# Altium footprint library Tracker_v1_1_pcb.PcbLib: 32 footprints (part 1 of 2)
Each footprint in its own frame and in the unit in brackets; x right, y up, seen from the top. Pads: shape width x height; smd on the part's side, far side on the other; paste and mask are expansions set on the pad; w line width, h text height; cw(c..) or ccw(c..) is an arc to the next point about the centre after c.
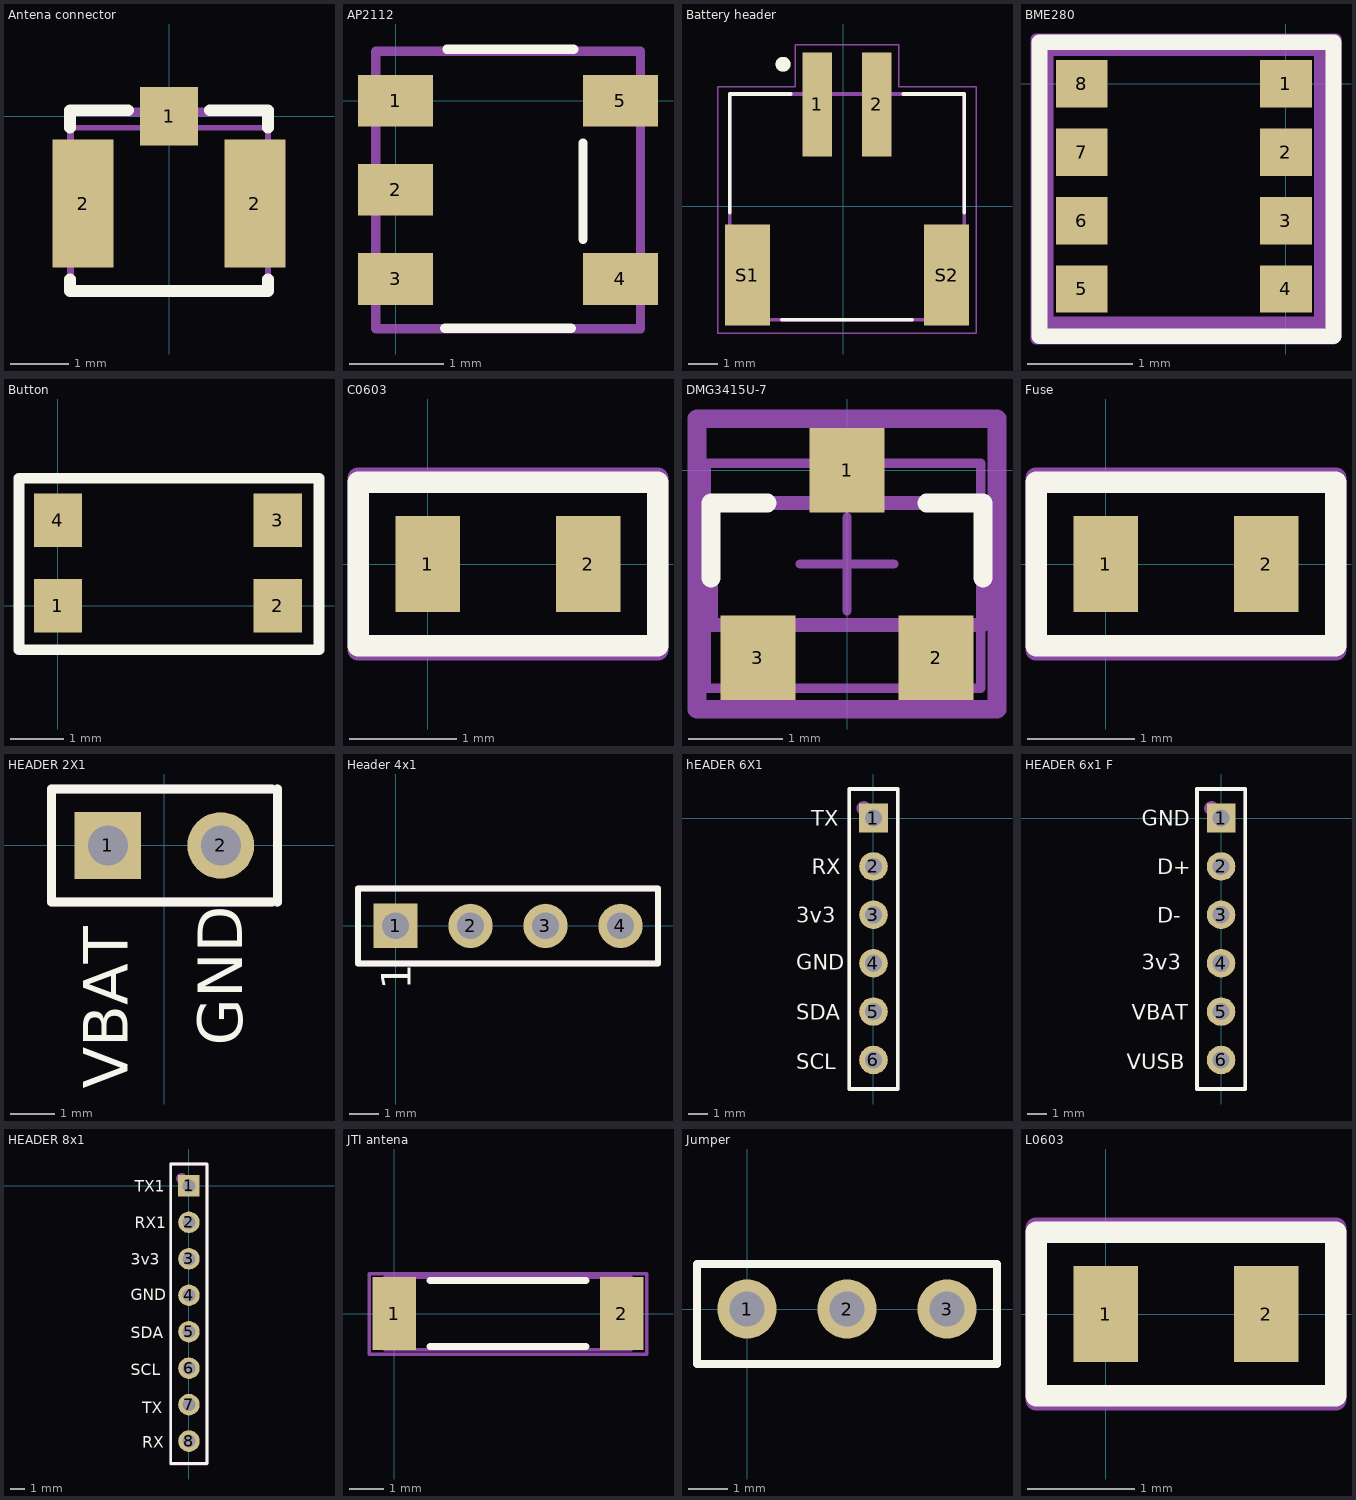
[diagram p0: the footprints below, top view; thin cyan lines are the x and y axes]

## Antena connector [mm]
pads (3):
  rect 1x1 smd: 1(0,0)
  rect 1.05x2.2 smd: 2(-1.475,-1.5) 2(1.475,-1.5)
Top Overlay:
  lines w0.2: -1.7,-2.8 -1.7,-3 1.7,-3 1.7,-2.8 ; -1.7,-0.2 -1.7,0.1 -0.7,0.1 ; 0.7,0.1 1.7,0.1 1.7,-0.2
Mechanical 16:
  lines w0.1: -1.7,-0.2 1.7,-0.2 ; -1.7,-3 -1.7,0.1 1.7,0.1 1.7,-3 -1.7,-3
Mechanical 29:
  lines w0.1: -1.69,-2.973 1.7,-2.973 1.7,0.047 -1.68,0.047 -1.68,-2.963 -1.69,-2.973
  text "'.Designator'" at -1.1,-1.673 h1
3D body "SW3dPS-UFL-R-SMD.STEP": height 1.25, standoff 0, extent -1.7,-2.923 1.7,0.177

## AP2112 [mm]
pads (5):
  rect 0.8x0.55 smd mask+0.05: 1(0,0) 2(0,-0.95) 3(0,-1.9) 4(2.4,-1.9) 5(2.4,0)
Top Overlay:
  lines w0.1: 0.525,-2.425 1.875,-2.425 ; 0.55,0.55 1.9,0.55 ; 2,-1.475 2,-0.45
Mechanical 29:
  lines w0.1: -0.212,-2.43 -0.212,0.53 2.613,0.53 2.613,-2.43 -0.212,-2.43
  text "'.Designator'" at 0.325,-1.25 h0.6
3D body "IC_Diodes_AP2112K-3.3TRG1_eec.STEP": height 1.3, standoff 0, extent -0.212,-2.43 2.613,0.53

## Battery header [mm]
pads (4):
  rect 1x3.5 smd: 1(-0.873,3.429) 2(1.127,3.429)
  rect 1.5x3.4 smd: S1(-3.223,-2.321) S2(3.477,-2.321)
Top Overlay:
  circle w0.3: c-2.023,4.779 r0.1
  lines w0.127: -3.823,-0.221 -3.823,3.779 -1.773,3.779 ; -2.073,-3.821 2.327,-3.821 ; 2.027,3.779 4.077,3.779 4.077,-0.221
Mechanical 4:
  circle w0.3: c-2.023,4.779 r0.1
  circle w0.3: c-2.023,4.779 r0.1
  lines w0.127: -3.823,-3.821 4.077,-3.821 ; -3.823,-3.821 -3.823,3.779 ; -3.823,-3.821 4.077,-3.821 ; -3.823,-3.821 -3.823,3.779 ; -3.823,3.779 4.077,3.779 ; -3.823,3.779 4.077,3.779 ; 4.077,-3.821 4.077,3.779 ; 4.077,-3.821 4.077,3.779
Mechanical 16:
  lines w0.05: -4.223,-4.271 4.477,-4.271 4.477,4.029 1.877,4.029 1.877,5.429 -1.623,5.429 -1.623,4.029 -4.223,4.029 -4.223,-4.271
3D body "S2B-PH-SM4-TB(LF)(SN)--3DModel-STEP-56544.STEP": height 5.5, standoff -0.1, extent -3.836,-3.665 4.064,4.935
3D body "S2B-PH-SM4-TB(LF)(SN)--3DModel-STEP-56544.STEP": height 5.5, standoff -0.1, extent -3.81,-4.191 4.09,4.409

## BME280 [mm]
pads (8):
  rect 0.49x0.45 smd: 1(0,0) 2(0,-0.65) 3(0,-1.3) 4(0,-1.95) 5(-1.94,-1.95) 6(-1.94,-1.3) 7(-1.94,-0.65) 8(-1.94,0)
Top Overlay:
  circle w0.2: c-0.057,0.014 r0.05
  lines w0.15: -2.343,-2.399 -2.343,0.395 0.451,0.395 0.451,-2.399 -2.343,-2.399
Mechanical 4:
  circle w0.2: c0.03,0.025 r0.05
  circle w0.2: c0.03,0.025 r0.05
  lines w0.127: -2.27,-2.275 0.33,-2.275 ; -2.27,-2.275 -2.27,0.325 ; -2.27,-2.275 0.33,-2.275 ; -2.27,-2.275 -2.27,0.325 ; -2.27,0.325 0.33,0.325 ; -2.27,0.325 0.33,0.325 ; 0.33,-2.275 0.33,0.325 ; 0.33,-2.275 0.33,0.325
Mechanical 29:
  circle w0.254: c-0.075,0.025 r0.035
  lines w0.1: -2.375,-2.425 0.45,-2.425 0.475,-2.4 0.475,0.425 -2.375,0.425 -2.375,-2.425
  text "'.Designator'" at -2.05,-1.25 h0.6
3D body "User Library-Bosch_BME280.STEP": height 0.92, standoff -0.01, extent -2.24,-2.245 0.26,0.255

## Button [mm]
pads (4):
  rect 0.9x1 smd: 1(0,0) 2(4.1,0) 3(4.1,1.6) 4(0,1.6)
Top Overlay:
  lines w0.2: -0.728,-0.82 4.872,-0.82 4.872,2.38 -0.728,2.38 -0.728,-0.82
Mechanical 29:
  lines w0.1: -0.728,-0.82 4.872,-0.82 4.872,2.38 -0.728,2.38 -0.728,-0.82
  text "'.Designator'" at 0.794,0.34 h0.8
3D body "User Library-Switch-CK-KMR2.STEP": height 2.1, standoff 0, extent -0.248,-0.71 4.352,2.29

## C0603 [mm]
pads (2):
  rect 0.6x0.9 smd: 1(0,0) 2(1.5,0)
Top Overlay:
  lines w0.2: -0.647,-0.762 -0.647,0.762 2.147,0.762 2.147,-0.762 -0.647,-0.762
Mechanical 29:
  lines w0.2: -0.65,-0.8 -0.65,0.8 2.15,0.8 2.15,-0.8 -0.65,-0.8
  text "'.Designator'" at -0.125,-0.45 h0.6
3D body "74394.stp": height 0.81, standoff -0.06, extent -0.125,-0.475 1.625,0.475
3D body "74416.stp": height 0.91, standoff -0.04, extent -0.125,-0.475 1.625,0.475
3D body "74394.stp": height 0.98, standoff 0.03, extent -0.125,-0.425 1.625,0.445

## DMG3415U-7 [mm]
pads (3):
  rect 0.8x0.9 smd paste+0 mask+0: 1(0,0) 2(0.95,-2) 3(-0.95,-2)
Top Overlay:
  lines w0.2: -1.45,-1.15 -1.45,-0.35 -0.85,-0.35 ; 0.85,-0.35 1.45,-0.35 1.45,-1.15
Mechanical 10:
  lines w0.2: -1.6,-2.55 1.6,-2.55 1.6,0.55 -1.6,0.55 -1.6,-2.55
  text ".Designator" at 0,-1 h1
Mechanical 12:
  lines w0.15: -1.45,-1.65 1.45,-1.65 1.45,-0.35 -1.45,-0.35 -1.45,-1.65
Mechanical 15:
  lines w0.1: -0.5,-1 0.5,-1 ; 0,-1.5 0,-0.5
  lines w0.2: -1.6,-2.55 1.6,-2.55 1.6,0.55 -1.6,0.55 -1.6,-2.55
Mechanical 29:
  lines w0.1: -1.5,-2.325 -1.5,0.075 1.425,0.075 1.425,-2.325 -1.5,-2.325
  text "'.Designator'" at -0.95,-1.375 h0.6
3D body "Trans_Diodes_DMG3415U-7_eec.STEP": height 1.02, standoff -0.01, extent -1.45,-2.337 1.45,0.093

## Fuse [mm]
pads (2):
  rect 0.6x0.9 smd: 1(0,0) 2(1.5,0)
Top Overlay:
  lines w0.2: -0.647,-0.762 2.147,-0.762 2.147,0.762 -0.647,0.762 -0.647,-0.762
Mechanical 29:
  lines w0.2: -0.65,-0.8 2.15,-0.8 2.15,0.8 -0.65,0.8 -0.65,-0.8
  text "'.Designator'" at -0.2,-0.3 h0.6
3D body "User Library-ptc06032-1.step": height 0.73, standoff -0.02, extent -0.05,-0.375 1.55,0.375

## HEADER 2X1 [mm]
pads (2):
  rect 1.5x1.5 hole 0.9: 1(-1.27,0)
  round 1.5 hole 0.9: 2(1.27,0)
Top Overlay:
  lines w0.2: 2.413,-1.27 -2.54,-1.27 -2.54,1.27 2.413,1.27 ; 2.54,-1.27 2.54,1.27
  text "VBAT" at -0.825,-5.475 h1
  text "GND" at 1.75,-4.5 h1
Mechanical 29:
  circle w0.5: c-1.27,0 r0.254
  lines w0.2: -2.54,-1.27 -2.54,1.27 2.54,1.27 2.54,-1.27 -2.54,-1.27
  text "'.Designator'" at -0.635,-0.508 h0.8

## Header 4x1 [mm]
pads (4):
  rect 1.5x1.5 hole 0.9: 1(0,0)
  round 1.5 hole 0.9: 2(2.54,0) 3(5.08,0) 4(7.62,0)
Top Overlay:
  lines w0.2: -1.27,-1.27 -1.27,1.27 8.89,1.27 8.89,-1.27 -1.27,-1.27
  text "1" at 0.508,-2.159 h1
Mechanical 29:
  circle w0.5: c0,0 r0.254
  lines w0.2: -1.27,-1.27 -1.27,1.27 8.89,1.27 8.89,-1.27 -1.27,-1.27
  text "'.Designator'" at 1.143,-0.381 h0.8

## hEADER 6X1 [mm]
pads (6):
  rect 1.5x1.5 hole 0.9: 1(0,0)
  round 1.5 hole 0.9: 2(0,-2.54) 3(0,-5.08) 4(0,-7.62) 5(0,-10.16) 6(0,-12.7)
Top Overlay:
  lines w0.2: -1.27,-14.224 -1.27,1.524 1.27,1.524 1.27,-14.224 -1.27,-14.224
  text "RX" at -3.25,-2.95 h0.8
  text "TX" at -3.275,-0.4 h0.8
  text "GND" at -4.05,-7.975 h0.8
  text "3v3" at -4.05,-5.5 h0.8
  text "SDA" at -4.05,-10.6 h0.8
  text "SCL" at -4.05,-13.175 h0.8
Mechanical 29:
  circle w0.254: c-0.508,0.508 r0.254
  lines w0.2: -1.27,-14.224 -1.27,1.524 1.27,1.524 1.27,-14.224 -1.27,-14.224
  text "'.Designator'" at 0.254,-11.684 h0.8

## HEADER 6x1 F [mm]
pads (6):
  rect 1.5x1.5 hole 0.9: 1(0,0)
  round 1.5 hole 0.9: 2(0,-2.54) 3(0,-5.08) 4(0,-7.62) 5(0,-10.16) 6(0,-12.7)
Top Overlay:
  lines w0.2: -1.27,-14.224 1.27,-14.224 1.27,1.524 -1.27,1.524 -1.27,-14.224
  text "VUSB" at -4.95,-13.175 h0.8
  text "VBAT" at -4.683,-10.6 h0.8
  text "D-" at -3.351,-5.5 h0.8
  text "3v3" at -4.15,-7.975 h0.8
  text "GND" at -4.15,-0.4 h0.8
  text "D+" at -3.351,-2.95 h0.8
Mechanical 29:
  circle w0.254: c-0.508,0.508 r0.254
  lines w0.2: -1.27,-14.224 1.27,-14.224 1.27,1.524 -1.27,1.524 -1.27,-14.224
  text "'.Designator'" at 0.254,-11.684 h0.8

## HEADER 8x1 [mm]
pads (8):
  rect 1.5x1.5 hole 0.9: 1(0,0)
  round 1.5 hole 0.9: 2(0,-2.54) 3(0,-5.08) 4(0,-7.62) 5(0,-10.16) 6(0,-12.7) 7(0,-15.24) 8(0,-17.78)
Top Overlay:
  lines w0.2: -1.27,-19.35 -1.27,1.524 1.27,1.524 1.27,-19.35 -1.27,-19.35
  text "RX1" at -3.783,-2.95 h0.8
  text "TX1" at -3.783,-0.4 h0.8
  text "GND" at -4.05,-7.975 h0.8
  text "3v3" at -4.05,-5.5 h0.8
  text "SDA" at -4.05,-10.6 h0.8
  text "SCL" at -4.05,-13.175 h0.8
  text "TX" at -3.25,-15.825 h0.8
  text "RX" at -3.25,-18.25 h0.8
Mechanical 29:
  circle w0.254: c-0.508,0.508 r0.254
  lines w0.2: -1.27,-19.375 -1.27,1.524 1.27,1.524 1.27,-19.375 -1.27,-19.375
  text "'.Designator'" at 0.254,-11.684 h0.8

## JTI antena [mm]
height 0.5
pads (2):
  rect 1.25x2.1 smd: 1(0,0) 2(6.55,0)
Top Overlay:
  lines w0.2: 1.025,-0.95 5.525,-0.95 ; 1.025,0.95 5.525,0.95
Mechanical 29:
  lines w0.1: -0.725,-1.175 7.275,-1.175 7.275,1.15 -0.725,1.15 -0.725,-1.175 ; -0.275,-1.05 6.825,-1.05 6.825,1.05 -0.275,1.05 -0.275,-1.05
  text "'.Designator'" at 1.35,-0.35 h0.8
3D body: height 0.5, standoff 0, extent 6.05,-1.075 6.85,1.025
3D body: height 0.5, standoff 0, extent 0.55,-1.075 6.05,1.025
3D body: height 0.5, standoff 0, extent -0.25,-1.075 0.55,1.025

## Jumper [mm]
pads (3):
  round 1.5 hole 0.9: 1(0,0) 2(2.54,0) 3(5.08,0)
Top Overlay:
  lines w0.2: -1.27,-1.397 6.35,-1.397 6.35,1.143 -1.27,1.143 -1.27,-1.397

## L0603 [mm]
pads (2):
  rect 0.6x0.9 smd: 1(0,0) 2(1.5,0)
Top Overlay:
  lines w0.2: -0.647,-0.762 2.147,-0.762 2.147,0.762 -0.647,0.762 -0.647,-0.762
Mechanical 29:
  lines w0.2: -0.65,-0.8 2.15,-0.8 2.15,0.8 -0.65,0.8 -0.65,-0.8
  text "'.Designator'" at -0.125,-0.45 h0.6
3D body "45630.stp": height 0.75, standoff -0.05, extent -0.05,-0.4 1.55,0.4